# Altium footprint library Apalis Evaluation Board.PcbLib: 212 footprints (part 2 of 14)
Each footprint in its own frame and in the unit in brackets; x right, y up, seen from the top. Pads: shape width x height; smd on the part's side, far side on the other; paste and mask are expansions set on the pad; w line width, h text height; cw(c..) or ccw(c..) is an arc to the next point about the centre after c.
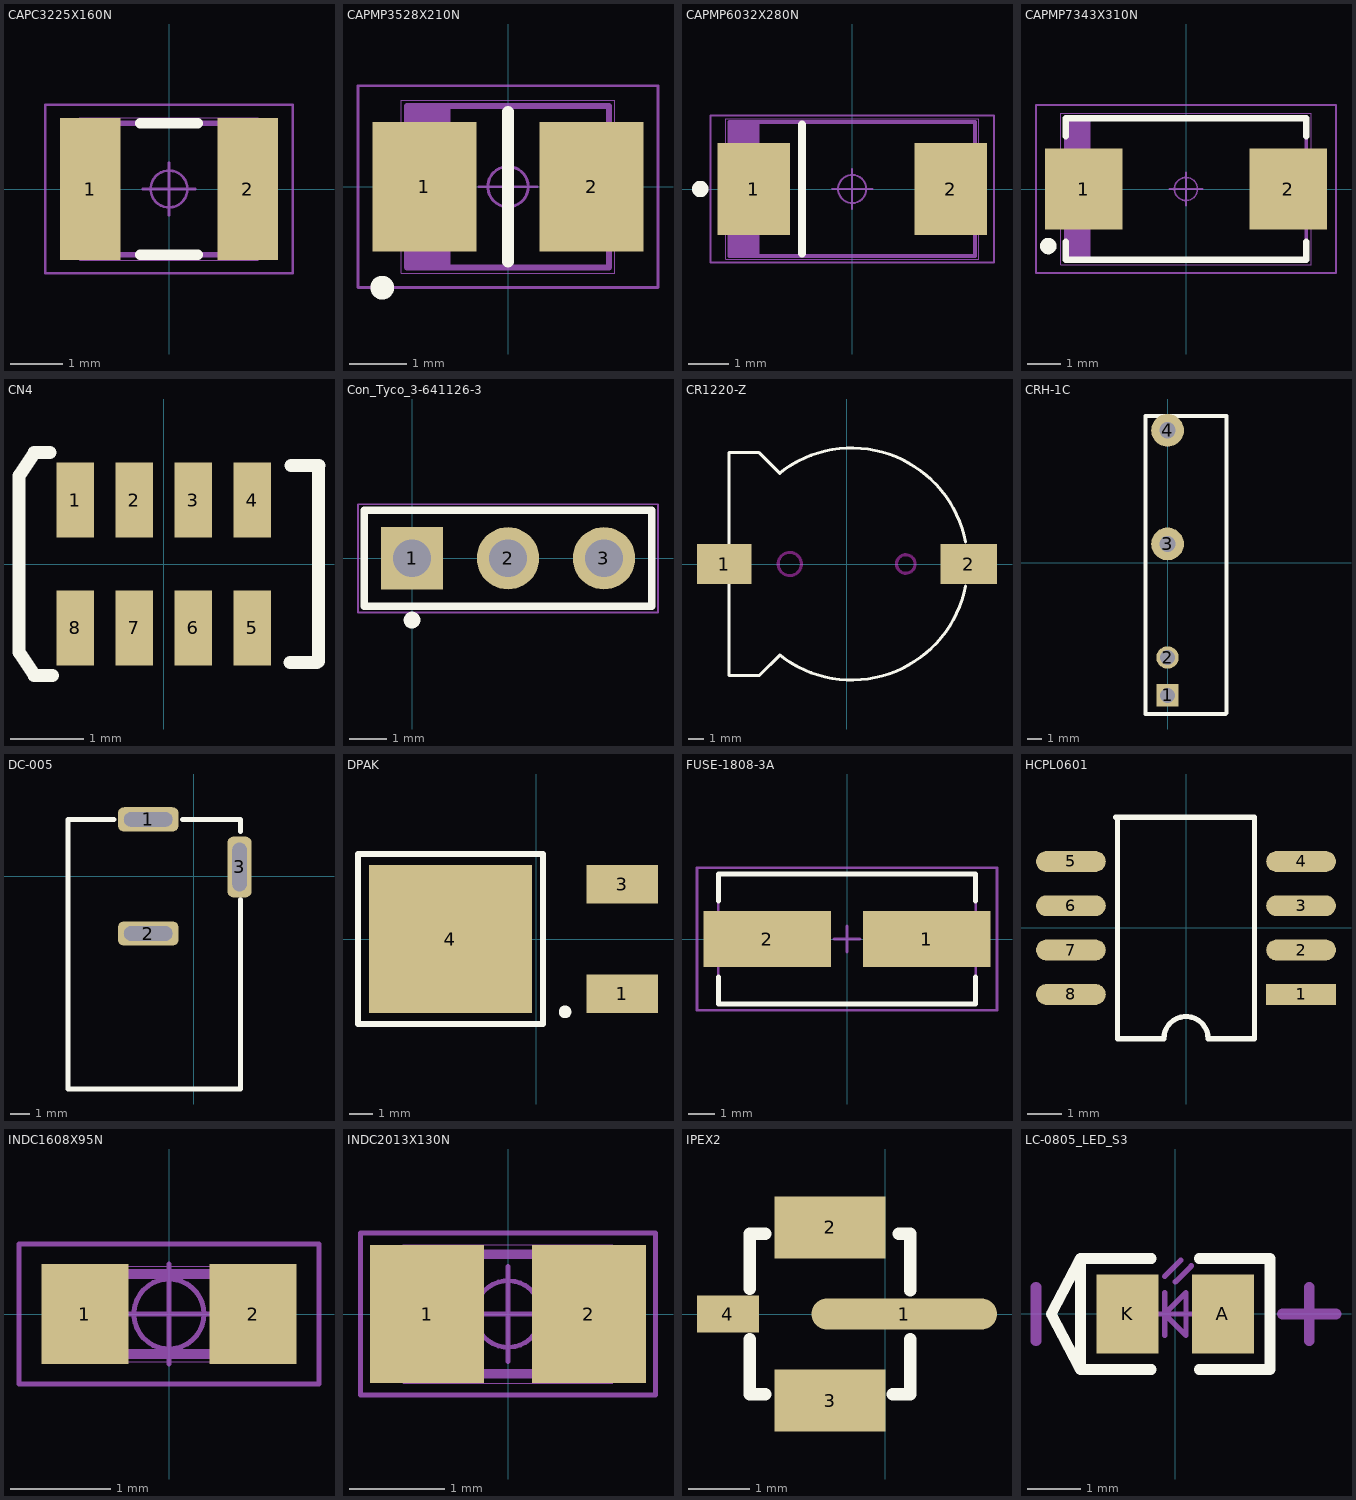
[diagram p1: the footprints below, top view; thin cyan lines are the x and y axes]

## CAPC3225X160N [mm] "C1210"
height 1.9
pads (2):
  rect 1.15x2.7 smd: 1(-1.5,0) 2(1.5,0)
Top Overlay:
  lines w0.2: -0.55,-1.25 0.55,-1.25 ; -0.55,1.25 0.55,1.25
Mechanical 1:
  circle w0.05: c0,0 r0.35
  lines w0.05: -0.5,0 0.5,0 ; 0,-0.5 0,0.5 ; -2.35,-1.6 -2.35,1.6 2.35,1.6 2.35,-1.6 -2.35,-1.6
Mechanical 2:
  lines w0.001: -1.7,-1.35 -1.7,1.35 1.7,1.35 1.7,-1.35 -1.7,-1.35
Mechanical 3:
  lines w0.1: -1.6,-1.25 -1.6,1.25 1.6,1.25 1.6,-1.25 -1.6,-1.25
3D body: height 1.9, standoff 0, extent -1.7,-1.35 1.7,1.35

## CAPMP3528X210N [mm]
height 1.9
pads (2):
  rect 1.8x2.25 smd: 1(-1.45,0) 2(1.45,0)
Top Overlay:
  circle w0.25: c-2.18,-1.75 r0.08
  lines w0.2: 0,-1.3 0,1.3
Mechanical 1:
  circle w0.05: c0,0 r0.35
  lines w0.05: -0.5,0 0.5,0 ; 0,-0.5 0,0.5 ; -2.6,-1.75 -2.6,1.75 2.6,1.75 2.6,-1.75 -2.6,-1.75
Mechanical 2:
  lines w0.001: -1.85,-1.5 -1.85,1.5 1.85,1.5 1.85,-1.5 -1.85,-1.5
Mechanical 3:
  lines w0.1: -1.65,-1.4 -1.65,1.4 ; -1.55,-1.4 -1.55,1.4 ; -1.45,-1.4 -1.45,1.4 ; -1.35,-1.4 -1.35,1.4 ; -1.25,-1.4 -1.25,1.4 ; -1.15,-1.4 -1.15,1.4 ; -1.05,-1.4 -1.05,1.4 ; -1.75,-1.4 -1.75,1.4 ; -1.75,-1.4 -1.75,1.4 ; -1.75,-1.4 1.75,-1.4 1.75,1.4 -1.75,1.4
3D body: height 1.9, standoff 0, extent -0.991,-1.5 1.85,1.5
3D body: height 1.9, standoff 0, extent -1.85,-1.5 -0.991,1.5

## CAPMP6032X280N [mm] "Cap Polarized 6032"
height 2.8
pads (2):
  rect 1.8x2.3 smd: 1(-2.45,0) 2(2.45,0)
Top Overlay:
  circle w0.25: c-3.78,0 r0.08
  lines w0.2: -1.25,-1.6 -1.25,1.6
Mechanical 1:
  circle w0.05: c0,0 r0.35
  lines w0.05: -0.5,0 0.5,0 ; 0,-0.5 0,0.5 ; -3.53,-1.83 3.53,-1.83 3.53,1.83 -3.53,1.83 -3.53,-1.83
Mechanical 2:
  lines w0.001: -3.15,-1.75 -3.15,1.75 3.15,1.75 3.15,-1.75 -3.15,-1.75
Mechanical 3:
  lines w0.1: -2.95,-1.67 -2.95,1.67 ; -2.85,-1.67 -2.85,1.67 ; -2.75,-1.67 -2.75,1.67 ; -2.65,-1.67 -2.65,1.67 ; -2.55,-1.67 -2.55,1.67 ; -2.45,-1.67 -2.45,1.67 ; -2.35,-1.67 -2.35,1.67 ; -3.05,-1.67 -3.05,1.67 3.05,1.67 3.05,-1.67 -3.05,-1.67
3D body: height 2.8, standoff 0, extent -2.25,-1.75 3.15,1.75
3D body: height 2.8, standoff 0, extent -3.15,-1.75 -2.25,1.75

## CAPMP7343X310N [mm] "CASE-D_7343"
height 2.8
pads (2):
  rect 2.35x2.45 smd: 1(-3.1,0) 2(3.1,0)
Top Overlay:
  circle w0.25: c-4.176,-1.73 r0.125
  lines w0.2: -3.65,-1.6 -3.65,-2.15 3.65,-2.15 3.65,-1.6 ; -3.65,1.6 -3.65,2.15 3.65,2.15 3.65,1.6
Mechanical 1:
  circle w0.05: c0,0 r0.35
  lines w0.05: -0.5,0 0.5,0 ; 0,-0.5 0,0.5 ; -4.55,-2.55 -4.55,2.55 4.55,2.55 4.55,-2.55 -4.55,-2.55
Mechanical 2:
  lines w0.001: -3.8,-2.3 -3.8,2.3 3.8,2.3 3.8,-2.3 -3.8,-2.3
Mechanical 3:
  lines w0.1: -3.55,-2.15 -3.55,2.15 ; -3.45,-2.15 -3.45,2.15 ; -3.35,-2.15 -3.35,2.15 ; -3.25,-2.15 -3.25,2.15 ; -3.15,-2.15 -3.15,2.15 ; -3.05,-2.15 -3.05,2.15 ; -2.95,-2.15 -2.95,2.15 ; -3.65,-2.15 -3.65,2.15 ; -3.65,-2.15 -3.65,2.15 ; -3.65,-2.15 3.65,-2.15 3.65,2.15 -3.65,2.15
3D body: height 2.8, standoff 0, extent -3.8,-2.3 -2.9,2.3
3D body: height 2.8, standoff 0, extent -2.9,-2.3 3.8,2.3

## CN4 [mil]
pads (8):
  rect 20x40 smd: 1(-47.25,34.09) 2(-15.75,34.09) 3(15.75,34.09) 4(47.25,34.09) 5(47.25,-34.09) 6(15.75,-34.09) 7(-15.75,-34.09) 8(-47.25,-34.09)
Top Overlay:
  lines w7: -77.25,-47.13 -77.25,47.13 ; -77.08,-47.49 -69.08,-59.49 -59.33,-59.49 ; -77.08,47.51 -69.08,59.51 -60.67,59.51 ; 67.39,-52.49 81.92,-52.49 ; 67.98,52.51 82.92,52.51 ; 82.75,-52.13 82.75,52.13

## Con_Tyco_3-641126-3 [mm] "Connector; Header; 3 Position FAN"
height 10
pads (3):
  rect 1.65x1.65 hole 1: 1(0,0)
  round 1.65 hole 1: 2(2.54,0) 3(5.08,0)
Top Overlay:
  circle w0.254: c0,-1.635 r0.095
  lines w0.2: -1.27,-1.27 -1.27,1.27 6.35,1.27 6.35,-1.27 -1.27,-1.27
Mechanical 1:
  lines w0.05: -1.43,-1.43 -1.43,1.43 6.51,1.43 6.51,-1.43 -1.43,-1.43
Mechanical 2:
  lines w0.001: -1.27,-1.27 6.35,-1.27 6.35,1.27 -1.27,1.27 -1.27,-1.27
Mechanical 3:
  lines w0.1: -1.27,-1.27 6.35,-1.27 6.35,1.27 -1.27,1.27 -1.27,-1.27
3D body "Samtec-TSW-103-07-G-S, Jumper with 3 pins, male.step": height 8.4, standoff -2.52, extent -1.27,-1.27 6.35,1.27

## CR1220-Z [mm]
pads (2):
  rect 3.54x2.6 smd: 1(-7.9,0)
  rect 3.66x2.6 smd: 2(7.9,0)
Top Overlay:
  lines w0.203: -7.61,-1.3 -7.61,-7.2 -5.944,-7.2 ; -7.61,1.3 -7.61,7.2 -5.817,7.2 ; -6.249,-7.2 -5.627,-7.2 -4.32,-5.893 ; -6.096,7.2 -5.653,7.2 -4.32,5.867 ; -4.287,-5.91 ccw(c0.33,0) 7.692,-1.431 ; -4.287,5.91 cw(c0.33,0) 7.692,1.431
Keep-Out Layer:
  circle w0.203: c-3.67,0 r0.75
  circle w0.203: c3.83,0 r0.6

## CRH-1C [mm]
pads (4):
  rect 1.5x1.5 hole 1: 1(0,-8.89)
  round 1.5 hole 1: 2(0,-6.35)
  round 2.2 hole 1.1: 3(0,1.27) 4(0,8.89)
Top Overlay:
  lines w0.254: -1.473,-10.14 3.894,-10.14 3.95,-10.084 3.95,9.86 -1.473,9.86 -1.473,-10.14

## DC-005 [mil]
pads (3):
  rrect50% 125x50 hole 30 slot 100 at 0 deg: 1(-94,117.5) 2(-94,-117.5)
  rrect50% 50x125 hole 30 slot 100 at 90 deg: 3(94,19.5)
Top Overlay:
  lines w10: -164,117.5 -259,117.5 -259,-437.5 96,-437.5 96,-47.5 ; -24,117.5 96,117.5 96,92.5

## DPAK [mm]
pads (3):
  rect 3x1.6 smd: 1(3.59,-2.285) 3(3.59,2.285)
  rect 6.8x6.2 smd: 4(-3.59,0)
Top Overlay:
  circle w0.254: c1.202,-3.047 r0.137
  lines w0.254: -7.459,-3.555 0.288,-3.555 0.288,3.557 -7.459,3.557 -7.459,-3.555

## FUSE-1808-3A [mm]
pads (2):
  rect 4.9x2.15 smd: 1(3.075,0) 2(-3.075,0)
Top Overlay:
  lines w0.2: -4.95,-1.475 -4.95,-2.5 4.95,-2.5 4.95,-1.475 ; -4.95,1.475 -4.95,2.5 4.95,2.5 4.95,1.475
Mechanical 13:
  lines w0.1: -4.95,-2.5 4.95,-2.5 4.95,2.5 -4.95,2.5 -4.95,-2.5
Mechanical 15:
  lines w0.1: -0.5,0 0.5,0 ; 0,-0.5 0,0.5 ; -5.775,-2.75 5.775,-2.75 5.775,2.75 -5.775,2.75 -5.775,-2.75

## HCPL0601 [mm]
pads (8):
  rect 2x0.6 smd: 1(3.3,-1.905)
  oval 2x0.6 smd: 2(3.3,-0.635) 3(3.3,0.635) 4(3.3,1.905) 5(-3.3,1.905) 6(-3.3,0.635) 7(-3.3,-0.635) 8(-3.3,-1.905)
Top Overlay:
  lines w0.15: -2.02,3.175 1.91,3.175 ; -1.965,3.175 -1.965,-3.175 -0.635,-3.175 cw(c0,-3.175) 0.635,-3.175 1.965,-3.175 1.965,3.175
3D body "User Library-so8-3.STEP": height 1.7, standoff 0, extent -2.975,-2.413 3.025,2.487

## INDC1608X95N [mm] "0603"
height 0.6
pads (2):
  rect 0.87x1 smd: 1(-0.84,0) 2(0.84,0)
Mechanical 1:
  circle w0.05: c0,0 r0.35
  lines w0.05: -0.5,0 0.5,0 ; 0,-0.5 0,0.5 ; -1.5,-0.7 1.5,-0.7 1.5,0.7 -1.5,0.7 -1.5,-0.7
Mechanical 2:
  lines w0.001: -0.875,-0.475 0.875,-0.475 0.875,0.475 -0.875,0.475 -0.875,-0.475
Mechanical 3:
  lines w0.1: -0.8,-0.4 0.8,-0.4 0.8,0.4 -0.8,0.4 -0.8,-0.4
3D body: height 0.6, standoff 0, extent -0.875,-0.475 0.875,0.475

## INDC2013X130N [mm]
height 0.9
pads (2):
  rect 1.2x1.45 smd: 1(-0.85,0) 2(0.85,0)
Mechanical 1:
  circle w0.05: c0,0 r0.35
  lines w0.05: -0.5,0 0.5,0 ; 0,-0.5 0,0.5 ; -1.55,-0.85 -1.55,0.85 1.55,0.85 1.55,-0.85 -1.55,-0.85
Mechanical 2:
  lines w0.001: -1.1,-0.725 -1.1,0.725 1.1,0.725 1.1,-0.725 -1.1,-0.725
Mechanical 3:
  lines w0.1: -1,-0.625 -1,0.625 1,0.625 1,-0.625 -1,-0.625
3D body: height 0.9, standoff 0, extent -1.1,-0.725 1.1,0.725

## IPEX2 [mm] "天线底座"
pads (4):
  oval 3x0.5 smd: 1(0.311,0)
  rect 1.8x1 smd: 2(-0.889,1.4) 3(-0.889,-1.4)
  rect 1x0.6 smd: 4(-2.54,0)
Top Overlay:
  lines w0.2: -2.189,-0.411 -2.189,-1.3 -1.935,-1.3 ; -2.189,0.411 -2.189,1.3 -1.935,1.3 ; 0.127,-1.3 0.411,-1.3 0.411,-0.411 ; 0.224,1.3 0.411,1.3 0.411,0.381

## LC-0805_LED_S3 [mm]
pads (2):
  rect 1.16x1.47 smd: A(0.89,0) K(-0.89,0)
Top Overlay:
  lines w0.2: -0.45,-1.035 -1.77,-1.035 ; -0.45,1.035 -1.77,1.035 ; 0.45,-1.035 1.77,-1.035 1.77,1.035 0.45,1.035 ; -1.77,-1.035 -2.315,0 -1.77,1.035 ; -1.77,-1.035 -1.77,1.035
Mechanical 13:
  lines w0.1: -0.4,0 0.4,0 ; -0.2,-0.4 -0.2,0.4 ; -0.2,0.7 0.1,1 ; 0,0.6 0.3,0.9 ; -0.2,0 0.2,-0.4 0.2,0.4 -0.2,0
Mechanical 15:
  lines w0.203: -2.6,-0.5 -2.6,0.5 ; 2,0 3,0 ; 2.5,-0.5 2.5,0.5
3D body "User Library-led_0805.step": height 1.1, standoff 0, extent -1.01,-0.625 1.01,0.625